# Altium footprint library Connectors THD.PcbLib: 631 footprints (part 40 of 46)
Each footprint in its own frame and in the unit in brackets; x right, y up, seen from the top. Pads: shape width x height; smd on the part's side, far side on the other; paste and mask are expansions set on the pad; w line width, h text height; cw(c..) or ccw(c..) is an arc to the next point about the centre after c.
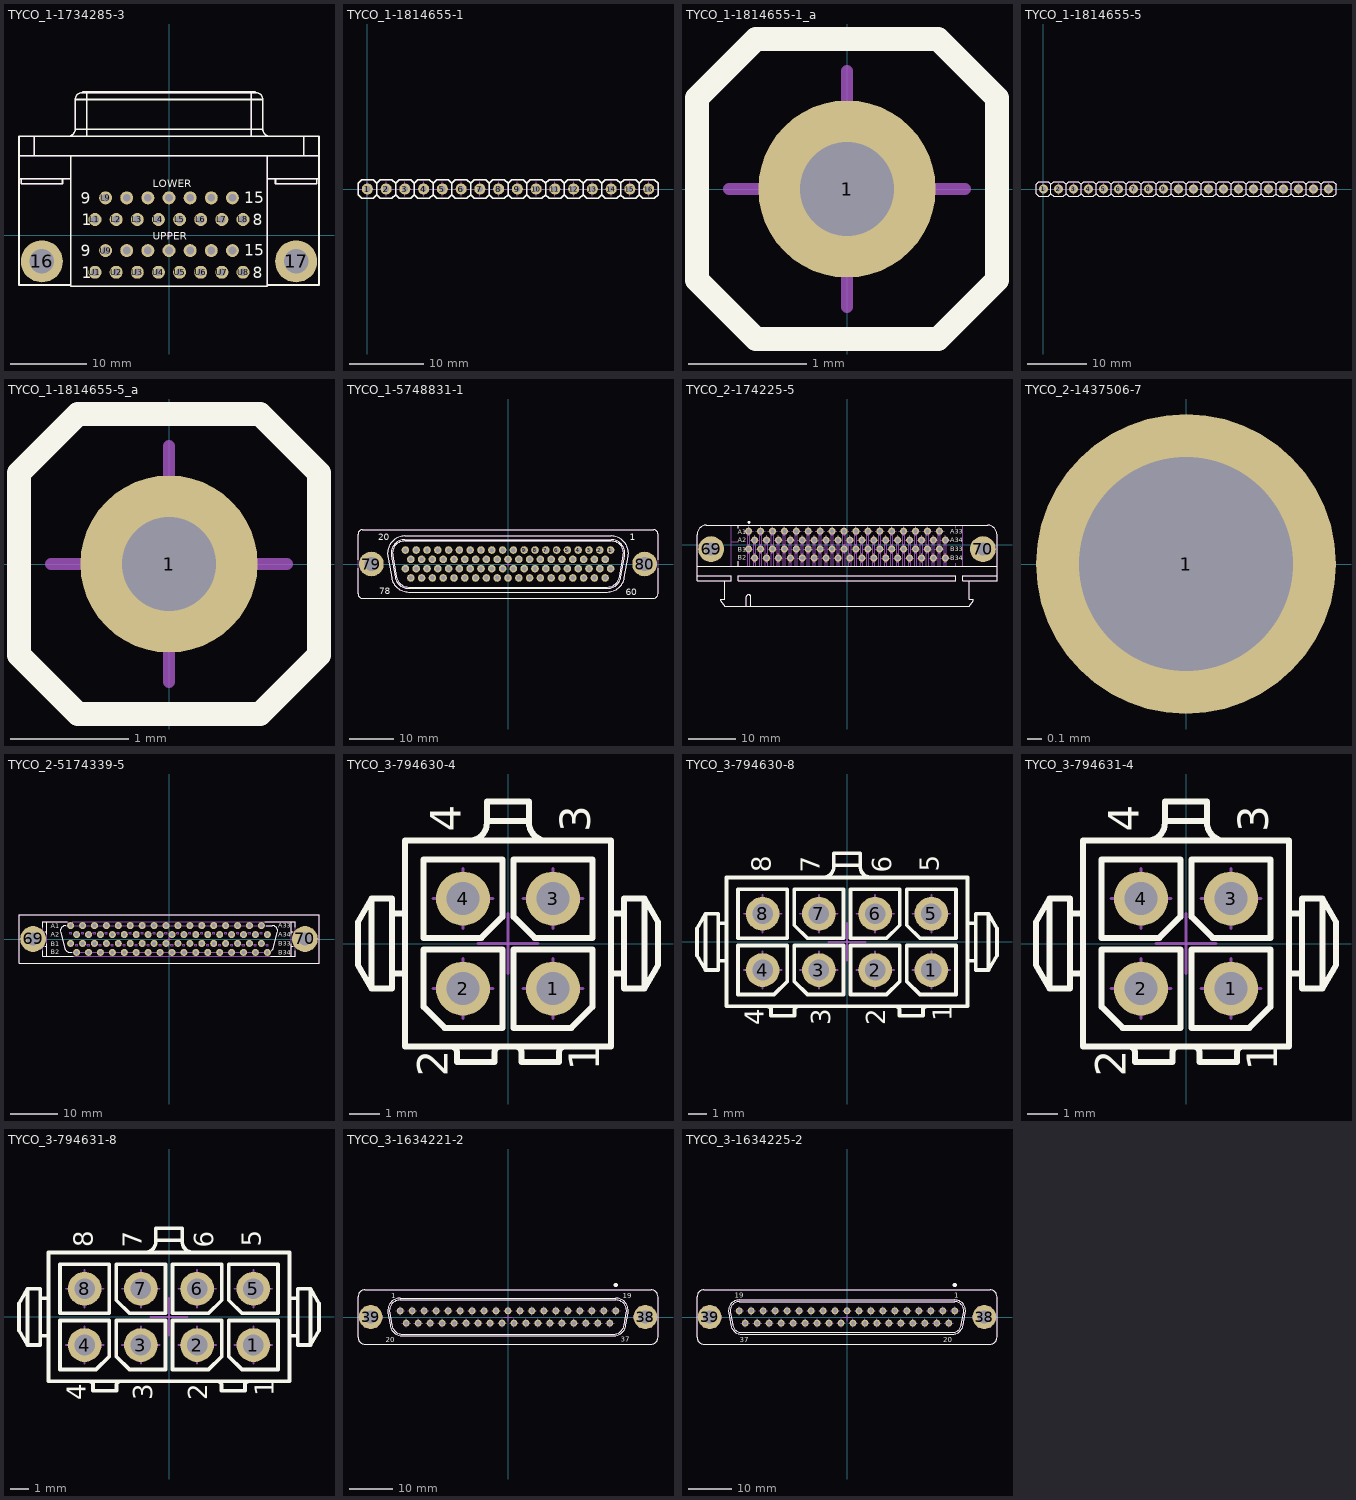
[diagram p39: the footprints below, top view; thin cyan lines are the x and y axes]

## TYCO_1-1734285-3 [mm] "Dual Stacked  Right Angled D-SUB 15 Pins Female Connector, With Threaded Insert UNC 4-40, And PCB Mount Retention"
height 31.9
pads (32):
  round 5.5 hole 3.2: 16(-16.65,-3.455) 17(16.65,-3.455)
  round 1.7 hole 1: L1(-9.695,2.035) L2(-6.925,2.035) L3(-4.155,2.035) L4(-1.385,2.035) L5(1.385,2.035) L6(4.155,2.035) L7(6.925,2.035) L8(9.695,2.035) L9(-8.31,4.875) L10(-5.54,4.875) L11(-2.77,4.875) L12(0,4.875) L13(2.77,4.875) L14(5.54,4.875) L15(8.31,4.875) U1(-9.695,-4.875) U2(-6.925,-4.875) U3(-4.155,-4.875) U4(-1.385,-4.875) U5(1.385,-4.875) U6(4.155,-4.875) U7(6.925,-4.875) U8(9.695,-4.875) U9(-8.31,-2.035) U10(-5.54,-2.035) U11(-2.77,-2.035) U12(0,-2.035) U13(2.77,-2.035) U14(5.54,-2.035) U15(8.31,-2.035)
Top Overlay:
  lines w0.2: -19.65,7.355 -12.9,7.355 ; -19.65,10.355 19.65,10.355 ; -19.35,7.355 -19.35,6.691 -13.95,6.691 -13.95,7.355 ; -17.65,10.355 -17.65,12.955 ; -13.2,12.955 ccw(c-13.2,13.855) -12.3,13.855 ; -12.9,-6.545 -19.65,-6.545 -19.65,12.955 19.65,12.955 19.65,-6.545 12.9,-6.545 ; -12.9,10.355 -12.9,-6.695 12.9,-6.695 12.9,10.355 ; -11.3,18.655 -11.3,18.755 11.3,18.755 11.3,18.655 ; -10.8,12.955 -10.8,18.755 ; 10.8,12.955 10.8,18.755 ; 12.9,7.355 19.65,7.355 ; 13.2,12.955 cw(c13.2,13.855) 12.3,13.855 ; 13.95,7.355 13.95,6.691 19.35,6.691 19.35,7.355 ; 17.65,10.355 17.65,12.955 ; -12.3,13.855 -12.3,17.755 ; -12.3,13.855 12.3,13.855 ; -12.3,17.755 cw(c-11.4,17.755) -11.4,18.655 11.399,18.655 cw(c11.4,17.755) 12.3,17.755 ; -12.3,17.755 12.3,17.755 ; 12.3,13.855 12.3,17.755
  text "15" at 9.881,-2.722 h1.5
  text "8" at 10.946,-5.637 h1.5
  text "1" at -11.454,-5.637 h1.5
  text "9" at -11.566,-2.797 h1.5
  text "9" at -11.566,4.113 h1.5
  text "1" at -11.454,1.273 h1.5
  text "8" at 10.946,1.273 h1.5
  text "15" at 9.881,4.188 h1.5
  text "UPPER" at -2.1,-0.65 h1
  text "LOWER" at -2.1,6.26 h1
Mechanical 8:
  lines w0.1: -10.195,-4.875 -9.695,-4.875 ; -10.195,2.035 -9.695,2.035 ; -9.695,-5.375 -9.695,-4.875 ; -9.695,-4.375 -9.695,-4.875 ; -9.695,1.535 -9.695,2.035 ; -9.695,2.535 -9.695,2.035 ; -9.195,-4.875 -9.695,-4.875 ; -9.195,2.035 -9.695,2.035 ; -8.81,-2.035 -8.31,-2.035 ; -8.81,4.875 -8.31,4.875 ; -8.31,-2.535 -8.31,-2.035 ; -8.31,-1.535 -8.31,-2.035 ; -8.31,4.375 -8.31,4.875 ; -8.31,5.375 -8.31,4.875 ; -7.81,-2.035 -8.31,-2.035 ; -7.81,4.875 -8.31,4.875 ; -7.425,-4.875 -6.925,-4.875 ; -7.425,2.035 -6.925,2.035 ; -6.925,-5.375 -6.925,-4.875 ; -6.925,-4.375 -6.925,-4.875 ; -6.925,1.535 -6.925,2.035 ; -6.925,2.535 -6.925,2.035 ; -6.425,-4.875 -6.925,-4.875 ; -6.425,2.035 -6.925,2.035 ; -6.04,-2.035 -5.54,-2.035 ; -6.04,4.875 -5.54,4.875 ; -5.54,-2.535 -5.54,-2.035 ; -5.54,-1.535 -5.54,-2.035 ; -5.54,4.375 -5.54,4.875 ; -5.54,5.375 -5.54,4.875 ; -5.04,-2.035 -5.54,-2.035 ; -5.04,4.875 -5.54,4.875 ; -4.66,-4.875 -4.16,-4.875 ; -4.66,2.035 -4.16,2.035 ; -4.16,-5.375 -4.16,-4.875 ; -4.16,-4.375 -4.16,-4.875 ; -4.16,1.535 -4.16,2.035 ; -4.16,2.535 -4.16,2.035 ; -3.66,-4.875 -4.16,-4.875 ; -3.66,2.035 -4.16,2.035 ; -3.27,-2.035 -2.77,-2.035 ; -3.27,4.875 -2.77,4.875 ; -2.77,-2.535 -2.77,-2.035 ; -2.77,-1.535 -2.77,-2.035 ; -2.77,4.375 -2.77,4.875 ; -2.77,5.375 -2.77,4.875 ; -2.27,-2.035 -2.77,-2.035 ; -2.27,4.875 -2.77,4.875 ; -1.885,-4.875 -1.385,-4.875 ; -1.885,2.035 -1.385,2.035 ; -1.385,-5.375 -1.385,-4.875 ; -1.385,-4.375 -1.385,-4.875 ; -1.385,1.535 -1.385,2.035 ; -1.385,2.535 -1.385,2.035 ; -0.885,-4.875 -1.385,-4.875 ; -0.885,2.035 -1.385,2.035 ; -0.5,-2.035 0,-2.035 ; -0.5,0 0,0 ; -0.5,4.875 0,4.875 ; 0,-2.535 0,-2.035 ; 0,-1.535 0,-2.035 ; 0,-0.5 0,0 ; 0,0.5 0,0 ; 0,4.375 0,4.875 ; 0,5.375 0,4.875 ; 0.5,-2.035 0,-2.035 ; 0.5,0 0,0 ; 0.5,4.875 0,4.875 ; 0.885,-4.875 1.385,-4.875 ; 0.885,2.035 1.385,2.035 ; 1.385,-5.375 1.385,-4.875 ; 1.385,-4.375 1.385,-4.875 ; 1.385,1.535 1.385,2.035 ; 1.385,2.535 1.385,2.035 ; 1.885,-4.875 1.385,-4.875 ; 1.885,2.035 1.385,2.035 ; 2.27,-2.035 2.77,-2.035 ; 2.27,4.875 2.77,4.875 ; 2.77,-2.535 2.77,-2.035 ; 2.77,-1.535 2.77,-2.035 ; 2.77,4.375 2.77,4.875 ; 2.77,5.375 2.77,4.875 ; 3.27,-2.035 2.77,-2.035 ; 3.27,4.875 2.77,4.875 ; 3.655,-4.875 4.155,-4.875 ; 3.655,2.035 4.155,2.035 ; 4.155,-5.375 4.155,-4.875 ; 4.155,-4.375 4.155,-4.875 ; 4.155,1.535 4.155,2.035 ; 4.155,2.535 4.155,2.035 ; 4.655,-4.875 4.155,-4.875 ; 4.655,2.035 4.155,2.035 ; 5.04,-2.035 5.54,-2.035 ; 5.04,4.875 5.54,4.875 ; 5.54,-2.535 5.54,-2.035 ; 5.54,-1.535 5.54,-2.035 ; 5.54,4.375 5.54,4.875 ; 5.54,5.375 5.54,4.875 ; 6.04,-2.035 5.54,-2.035 ; 6.04,4.875 5.54,4.875 ; 6.425,-4.875 6.925,-4.875 ; 6.425,2.035 6.925,2.035 ; 6.925,-5.375 6.925,-4.875 ; 6.925,-4.375 6.925,-4.875 ; 6.925,1.535 6.925,2.035 ; 6.925,2.535 6.925,2.035 ; 7.425,-4.875 6.925,-4.875 ; 7.425,2.035 6.925,2.035 ; 7.81,-2.035 8.31,-2.035 ; 7.81,4.875 8.31,4.875 ; 8.31,-2.535 8.31,-2.035 ; 8.31,-1.535 8.31,-2.035 ; 8.31,4.375 8.31,4.875 ; 8.31,5.375 8.31,4.875 ; 8.81,-2.035 8.31,-2.035 ; 8.81,4.875 8.31,4.875 ; 9.195,-4.875 9.695,-4.875 ; 9.195,2.035 9.695,2.035 ; 9.695,-5.375 9.695,-4.875 ; 9.695,-4.375 9.695,-4.875 ; 9.695,1.535 9.695,2.035 ; 9.695,2.535 9.695,2.035 ; 10.195,-4.875 9.695,-4.875 ; 10.195,2.035 9.695,2.035
Mechanical 14:
  drawing of 6656 lines, arcs and shapes, not listed
  text "UPPER" at -2.1,-0.65 h1
  text "LOWER" at -2.1,6.26 h1
  text "15" at 9.881,4.188 h1.5
  text "8" at 10.946,1.273 h1.5
  text "1" at -11.454,1.273 h1.5
  text "9" at -11.566,4.113 h1.5
  text "9" at -11.566,-2.797 h1.5
  text "1" at -11.454,-5.637 h1.5
  text "8" at 10.946,-5.637 h1.5
  text "15" at 9.881,-2.722 h1.5
3D body: height 31.6, standoff -3.55, extent -19.3,-7.675 20,17.825

## TYCO_1-1814655-1 [mm] "16 Positions, Pitch 2.54mm, Width 2.54mm, Heigh 4.4mm, SIP Straight Socket"
height 4.4
pads (16):
  round 1.5 hole 0.8: 1(0,0) 2(2.54,0) 3(5.08,0) 4(7.62,0) 5(10.16,0) 6(12.7,0) 7(15.24,0) 8(17.78,0) 9(20.32,0) 10(22.86,0) 11(25.4,0) 12(27.94,0) 13(30.48,0) 14(33.02,0) 15(35.56,0) 16(38.1,0)
Top Overlay:
  lines w0.2: 1.27,-0.77 0.77,-1.27 -0.77,-1.27 -1.27,-0.77 -1.27,0.77 -0.77,1.27 0.77,1.27 1.27,0.77 ; 1.27,-0.77 1.77,-1.27 3.31,-1.27 3.81,-0.77 ; 1.27,-0.77 1.27,0.77 ; 1.27,0.77 1.77,1.27 3.31,1.27 3.81,0.77 ; 3.81,-0.77 4.31,-1.27 5.85,-1.27 6.35,-0.77 ; 3.81,-0.77 3.81,0.77 ; 3.81,0.77 4.31,1.27 5.85,1.27 6.35,0.77 ; 6.35,-0.77 6.85,-1.27 8.39,-1.27 8.89,-0.77 ; 6.35,-0.77 6.35,0.77 ; 6.35,0.77 6.85,1.27 8.39,1.27 8.89,0.77 ; 8.89,-0.77 9.39,-1.27 10.93,-1.27 11.43,-0.77 ; 8.89,-0.77 8.89,0.77 ; 8.89,0.77 9.39,1.27 10.93,1.27 11.43,0.77 ; 11.43,-0.77 11.93,-1.27 13.47,-1.27 13.97,-0.77 ; 11.43,-0.77 11.43,0.77 ; 11.43,0.77 11.93,1.27 13.47,1.27 13.97,0.77 ; 13.97,-0.77 14.47,-1.27 16.01,-1.27 16.51,-0.77 ; 13.97,-0.77 13.97,0.77 ; 13.97,0.77 14.47,1.27 16.01,1.27 16.51,0.77 ; 16.51,-0.77 17.01,-1.27 18.55,-1.27 19.05,-0.77 ; 16.51,-0.77 16.51,0.77 ; 16.51,0.77 17.01,1.27 18.55,1.27 19.05,0.77 ; 19.05,-0.77 19.55,-1.27 21.09,-1.27 21.59,-0.77 ; 19.05,-0.77 19.05,0.77 ; 19.05,0.77 19.55,1.27 21.09,1.27 21.59,0.77 ; 21.59,-0.77 22.09,-1.27 23.63,-1.27 24.13,-0.77 ; 21.59,-0.77 21.59,0.77 ; 21.59,0.77 22.09,1.27 23.63,1.27 24.13,0.77 ; 24.13,-0.77 24.63,-1.27 26.17,-1.27 26.67,-0.77 ; 24.13,-0.77 24.13,0.77 ; 24.13,0.77 24.63,1.27 26.17,1.27 26.67,0.77 ; 26.67,-0.77 26.67,0.77 ; 26.67,-0.77 27.17,-1.27 28.71,-1.27 29.21,-0.77 ; 26.67,0.77 27.17,1.27 28.71,1.27 29.21,0.77 ; 29.21,-0.77 29.21,0.77 ; 29.21,-0.77 29.71,-1.27 31.25,-1.27 31.75,-0.77 ; 29.21,0.77 29.71,1.27 31.25,1.27 31.75,0.77 ; 31.75,-0.77 31.75,0.77 ; 31.75,-0.77 32.25,-1.27 33.79,-1.27 34.29,-0.77 ; 31.75,0.77 32.25,1.27 33.79,1.27 34.29,0.77 ; 34.29,-0.77 34.79,-1.27 36.33,-1.27 36.83,-0.77 ; 34.29,-0.77 34.29,0.77 ; 34.29,0.77 34.79,1.27 36.33,1.27 36.83,0.77 ; 36.83,-0.77 37.33,-1.27 38.87,-1.27 39.37,-0.77 39.37,0.77 38.87,1.27 37.33,1.27 36.83,0.77 ; 36.83,-0.77 36.83,0.77
Mechanical 8:
  lines w0.1: -1,0 0,0 ; 0,-1 0,0 ; 0,1 0,0 ; 1,0 0,0 ; 1.54,0 2.54,0 ; 2.54,-1 2.54,0 ; 2.54,1 2.54,0 ; 3.54,0 2.54,0 ; 4.08,0 5.08,0 ; 5.08,-1 5.08,0 ; 5.08,1 5.08,0 ; 6.08,0 5.08,0 ; 6.62,0 7.62,0 ; 7.62,-1 7.62,0 ; 7.62,1 7.62,0 ; 8.62,0 7.62,0 ; 9.16,0 10.16,0 ; 10.16,-1 10.16,0 ; 10.16,1 10.16,0 ; 11.16,0 10.16,0 ; 11.7,0 12.7,0 ; 12.7,-1 12.7,0 ; 12.7,1 12.7,0 ; 13.7,0 12.7,0 ; 14.24,0 15.24,0 ; 15.24,-1 15.24,0 ; 15.24,1 15.24,0 ; 16.24,0 15.24,0 ; 16.78,0 17.78,0 ; 17.78,-1 17.78,0 ; 17.78,1 17.78,0 ; 18.78,0 17.78,0 ; 19.32,0 20.32,0 ; 20.32,-1 20.32,0 ; 20.32,1 20.32,0 ; 21.32,0 20.32,0 ; 21.86,0 22.86,0 ; 22.86,-1 22.86,0 ; 22.86,1 22.86,0 ; 23.86,0 22.86,0 ; 24.4,0 25.4,0 ; 25.4,-1 25.4,0 ; 25.4,1 25.4,0 ; 26.4,0 25.4,0 ; 26.94,0 27.94,0 ; 27.94,-1 27.94,0 ; 27.94,1 27.94,0 ; 28.94,0 27.94,0 ; 29.48,0 30.48,0 ; 30.48,-1 30.48,0 ; 30.48,1 30.48,0 ; 31.48,0 30.48,0 ; 32.02,0 33.02,0 ; 33.02,-1 33.02,0 ; 33.02,1 33.02,0 ; 34.02,0 33.02,0 ; 34.56,0 35.56,0 ; 35.56,-1 35.56,0 ; 35.56,1 35.56,0 ; 36.56,0 35.56,0 ; 37.1,0 38.1,0 ; 38.1,-1 38.1,0 ; 38.1,1 38.1,0 ; 39.1,0 38.1,0
Mechanical 14:
  lines w0.1: 1.27,-0.77 0.77,-1.27 -0.77,-1.27 -1.27,-0.77 -1.27,0.77 -0.77,1.27 0.77,1.27 1.27,0.77 ; 1.27,-0.77 1.77,-1.27 3.31,-1.27 3.81,-0.77 ; 1.27,-0.77 1.27,0.77 ; 1.27,0.77 1.77,1.27 3.31,1.27 3.81,0.77 ; 3.81,-0.77 4.31,-1.27 5.85,-1.27 6.35,-0.77 ; 3.81,-0.77 3.81,0.77 ; 3.81,0.77 4.31,1.27 5.85,1.27 6.35,0.77 ; 6.35,-0.77 6.85,-1.27 8.39,-1.27 8.89,-0.77 ; 6.35,-0.77 6.35,0.77 ; 6.35,0.77 6.85,1.27 8.39,1.27 8.89,0.77 ; 8.89,-0.77 9.39,-1.27 10.93,-1.27 11.43,-0.77 ; 8.89,-0.77 8.89,0.77 ; 8.89,0.77 9.39,1.27 10.93,1.27 11.43,0.77 ; 11.43,-0.77 11.93,-1.27 13.47,-1.27 13.97,-0.77 ; 11.43,-0.77 11.43,0.77 ; 11.43,0.77 11.93,1.27 13.47,1.27 13.97,0.77 ; 13.97,-0.77 14.47,-1.27 16.01,-1.27 16.51,-0.77 ; 13.97,-0.77 13.97,0.77 ; 13.97,0.77 14.47,1.27 16.01,1.27 16.51,0.77 ; 16.51,-0.77 17.01,-1.27 18.55,-1.27 19.05,-0.77 ; 16.51,-0.77 16.51,0.77 ; 16.51,0.77 17.01,1.27 18.55,1.27 19.05,0.77 ; 19.05,-0.77 19.55,-1.27 21.09,-1.27 21.59,-0.77 ; 19.05,-0.77 19.05,0.77 ; 19.05,0.77 19.55,1.27 21.09,1.27 21.59,0.77 ; 21.59,-0.77 22.09,-1.27 23.63,-1.27 24.13,-0.77 ; 21.59,-0.77 21.59,0.77 ; 21.59,0.77 22.09,1.27 23.63,1.27 24.13,0.77 ; 24.13,-0.77 24.63,-1.27 26.17,-1.27 26.67,-0.77 ; 24.13,-0.77 24.13,0.77 ; 24.13,0.77 24.63,1.27 26.17,1.27 26.67,0.77 ; 26.67,-0.77 26.67,0.77 ; 26.67,-0.77 27.17,-1.27 28.71,-1.27 29.21,-0.77 ; 26.67,0.77 27.17,1.27 28.71,1.27 29.21,0.77 ; 29.21,-0.77 29.21,0.77 ; 29.21,-0.77 29.71,-1.27 31.25,-1.27 31.75,-0.77 ; 29.21,0.77 29.71,1.27 31.25,1.27 31.75,0.77 ; 31.75,-0.77 31.75,0.77 ; 31.75,-0.77 32.25,-1.27 33.79,-1.27 34.29,-0.77 ; 31.75,0.77 32.25,1.27 33.79,1.27 34.29,0.77 ; 34.29,-0.77 34.79,-1.27 36.33,-1.27 36.83,-0.77 ; 34.29,-0.77 34.29,0.77 ; 34.29,0.77 34.79,1.27 36.33,1.27 36.83,0.77 ; 36.83,-0.77 37.33,-1.27 38.87,-1.27 39.37,-0.77 39.37,0.77 38.87,1.27 37.33,1.27 36.83,0.77 ; 36.83,-0.77 36.83,0.77
3D body: height 4.4, standoff -2.9, extent -1.27,-1.27 39.37,1.27

## TYCO_1-1814655-1_a [mm] "1 of 16 Positions, Pitch 2.54mm, Width 2.54mm, Heigh 4.4mm, SIP Straight Socket"
height 4.4
pads (1):
  round 1.5 hole 0.8: 1(0,0)
Top Overlay:
  lines w0.2: -1.27,-0.77 -0.77,-1.27 0.77,-1.27 1.27,-0.77 1.27,0.77 0.77,1.27 -0.77,1.27 -1.27,0.77 -1.27,-0.77
Mechanical 8:
  lines w0.1: -1,0 0,0 ; 0,-1 0,0 ; 0,1 0,0 ; 1,0 0,0
Mechanical 14:
  lines w0.1: -1.27,-0.77 -0.77,-1.27 0.77,-1.27 1.27,-0.77 1.27,0.77 0.77,1.27 -0.77,1.27 -1.27,0.77 -1.27,-0.77
3D body: height 4.4, standoff -2.9, extent -1.27,-1.27 1.27,1.27

## TYCO_1-1814655-5 [mm] "20 Positions, Pitch 2.54mm, Width 2.54mm, Heigh 4.4mm, SIP Straight Socket"
height 4.4
pads (20):
  round 1.5 hole 0.8: 1(0,0) 2(2.54,0) 3(5.08,0) 4(7.62,0) 5(10.16,0) 6(12.7,0) 7(15.24,0) 8(17.78,0) 9(20.32,0) 10(22.86,0) 11(25.4,0) 12(27.94,0) 13(30.48,0) 14(33.02,0) 15(35.56,0) 16(38.1,0) 17(40.64,0) 18(43.18,0) 19(45.72,0) 20(48.26,0)
Top Overlay:
  lines w0.2: 1.27,-0.77 1.27,0.77 ; 1.27,-0.77 1.77,-1.27 3.31,-1.27 3.81,-0.77 ; 1.27,-0.77 0.77,-1.27 -0.77,-1.27 -1.27,-0.77 -1.27,0.77 -0.77,1.27 0.77,1.27 1.27,0.77 ; 1.27,0.77 1.77,1.27 3.31,1.27 3.81,0.77 ; 3.81,-0.77 3.81,0.77 ; 3.81,-0.77 4.31,-1.27 5.85,-1.27 6.35,-0.77 ; 3.81,0.77 4.31,1.27 5.85,1.27 6.35,0.77 ; 6.35,-0.77 6.35,0.77 ; 6.35,-0.77 6.85,-1.27 8.39,-1.27 8.89,-0.77 ; 6.35,0.77 6.85,1.27 8.39,1.27 8.89,0.77 ; 8.89,-0.77 8.89,0.77 ; 8.89,-0.77 9.39,-1.27 10.93,-1.27 11.43,-0.77 ; 8.89,0.77 9.39,1.27 10.93,1.27 11.43,0.77 ; 11.43,-0.77 11.43,0.77 ; 11.43,-0.77 11.93,-1.27 13.47,-1.27 13.97,-0.77 ; 11.43,0.77 11.93,1.27 13.47,1.27 13.97,0.77 ; 13.97,-0.77 13.97,0.77 ; 13.97,-0.77 14.47,-1.27 16.01,-1.27 16.51,-0.77 ; 13.97,0.77 14.47,1.27 16.01,1.27 16.51,0.77 ; 16.51,-0.77 16.51,0.77 ; 16.51,-0.77 17.01,-1.27 18.55,-1.27 19.05,-0.77 ; 16.51,0.77 17.01,1.27 18.55,1.27 19.05,0.77 ; 19.05,-0.77 19.05,0.77 ; 19.05,-0.77 19.55,-1.27 21.09,-1.27 21.59,-0.77 ; 19.05,0.77 19.55,1.27 21.09,1.27 21.59,0.77 ; 21.59,-0.77 21.59,0.77 ; 21.59,-0.77 22.09,-1.27 23.63,-1.27 24.13,-0.77 ; 21.59,0.77 22.09,1.27 23.63,1.27 24.13,0.77 ; 24.13,-0.77 24.13,0.77 ; 24.13,-0.77 24.63,-1.27 26.17,-1.27 26.67,-0.77 ; 24.13,0.77 24.63,1.27 26.17,1.27 26.67,0.77 ; 26.67,-0.77 27.17,-1.27 28.71,-1.27 29.21,-0.77 ; 26.67,-0.77 26.67,0.77 ; 26.67,0.77 27.17,1.27 28.71,1.27 29.21,0.77 ; 29.21,-0.77 29.71,-1.27 31.25,-1.27 31.75,-0.77 ; 29.21,-0.77 29.21,0.77 ; 29.21,0.77 29.71,1.27 31.25,1.27 31.75,0.77 ; 31.75,-0.77 32.25,-1.27 33.79,-1.27 34.29,-0.77 ; 31.75,-0.77 31.75,0.77 ; 31.75,0.77 32.25,1.27 33.79,1.27 34.29,0.77 ; 34.29,-0.77 34.29,0.77 ; 34.29,-0.77 34.79,-1.27 36.33,-1.27 36.83,-0.77 ; 34.29,0.77 34.79,1.27 36.33,1.27 36.83,0.77 ; 36.83,-0.77 36.83,0.77 ; 36.83,-0.77 37.33,-1.27 38.87,-1.27 39.37,-0.77 ; 36.83,0.77 37.33,1.27 38.87,1.27 39.37,0.77 ; 39.37,-0.77 39.87,-1.27 41.41,-1.27 41.91,-0.77 ; 39.37,-0.77 39.37,0.77 ; 39.37,0.77 39.87,1.27 41.41,1.27 41.91,0.77 ; 41.91,-0.77 41.91,0.77 ; 41.91,-0.77 42.41,-1.27 43.95,-1.27 44.45,-0.77 ; 41.91,0.77 42.41,1.27 43.95,1.27 44.45,0.77 ; 44.45,-0.77 44.95,-1.27 46.49,-1.27 46.99,-0.77 ; 44.45,-0.77 44.45,0.77 ; 44.45,0.77 44.95,1.27 46.49,1.27 46.99,0.77 ; 46.99,-0.77 47.49,-1.27 49.03,-1.27 49.53,-0.77 49.53,0.77 49.03,1.27 47.49,1.27 46.99,0.77 ; 46.99,-0.77 46.99,0.77
Mechanical 8:
  lines w0.1: -1,0 0,0 ; 0,-1 0,0 ; 0,1 0,0 ; 1,0 0,0 ; 1.54,0 2.54,0 ; 2.54,-1 2.54,0 ; 2.54,1 2.54,0 ; 3.54,0 2.54,0 ; 4.08,0 5.08,0 ; 5.08,-1 5.08,0 ; 5.08,1 5.08,0 ; 6.08,0 5.08,0 ; 6.62,0 7.62,0 ; 7.62,-1 7.62,0 ; 7.62,1 7.62,0 ; 8.62,0 7.62,0 ; 9.16,0 10.16,0 ; 10.16,-1 10.16,0 ; 10.16,1 10.16,0 ; 11.16,0 10.16,0 ; 11.7,0 12.7,0 ; 12.7,-1 12.7,0 ; 12.7,1 12.7,0 ; 13.7,0 12.7,0 ; 14.24,0 15.24,0 ; 15.24,-1 15.24,0 ; 15.24,1 15.24,0 ; 16.24,0 15.24,0 ; 16.78,0 17.78,0 ; 17.78,-1 17.78,0 ; 17.78,1 17.78,0 ; 18.78,0 17.78,0 ; 19.32,0 20.32,0 ; 20.32,-1 20.32,0 ; 20.32,1 20.32,0 ; 21.32,0 20.32,0 ; 21.86,0 22.86,0 ; 22.86,-1 22.86,0 ; 22.86,1 22.86,0 ; 23.86,0 22.86,0 ; 24.4,0 25.4,0 ; 25.4,-1 25.4,0 ; 25.4,1 25.4,0 ; 26.4,0 25.4,0 ; 26.94,0 27.94,0 ; 27.94,-1 27.94,0 ; 27.94,1 27.94,0 ; 28.94,0 27.94,0 ; 29.48,0 30.48,0 ; 30.48,-1 30.48,0 ; 30.48,1 30.48,0 ; 31.48,0 30.48,0 ; 32.02,0 33.02,0 ; 33.02,-1 33.02,0 ; 33.02,1 33.02,0 ; 34.02,0 33.02,0 ; 34.56,0 35.56,0 ; 35.56,-1 35.56,0 ; 35.56,1 35.56,0 ; 36.56,0 35.56,0 ; 37.1,0 38.1,0 ; 38.1,-1 38.1,0 ; 38.1,1 38.1,0 ; 39.1,0 38.1,0 ; 39.64,0 40.64,0 ; 40.64,-1 40.64,0 ; 40.64,1 40.64,0 ; 41.64,0 40.64,0 ; 42.18,0 43.18,0 ; 43.18,-1 43.18,0 ; 43.18,1 43.18,0 ; 44.18,0 43.18,0 ; 44.72,0 45.72,0 ; 45.72,-1 45.72,0 ; 45.72,1 45.72,0 ; 46.72,0 45.72,0 ; 47.26,0 48.26,0 ; 48.26,-1 48.26,0 ; 48.26,1 48.26,0 ; 49.26,0 48.26,0
Mechanical 14:
  lines w0.1: 1.27,-0.77 1.27,0.77 ; 1.27,-0.77 1.77,-1.27 3.31,-1.27 3.81,-0.77 ; 1.27,-0.77 0.77,-1.27 -0.77,-1.27 -1.27,-0.77 -1.27,0.77 -0.77,1.27 0.77,1.27 1.27,0.77 ; 1.27,0.77 1.77,1.27 3.31,1.27 3.81,0.77 ; 3.81,-0.77 3.81,0.77 ; 3.81,-0.77 4.31,-1.27 5.85,-1.27 6.35,-0.77 ; 3.81,0.77 4.31,1.27 5.85,1.27 6.35,0.77 ; 6.35,-0.77 6.35,0.77 ; 6.35,-0.77 6.85,-1.27 8.39,-1.27 8.89,-0.77 ; 6.35,0.77 6.85,1.27 8.39,1.27 8.89,0.77 ; 8.89,-0.77 8.89,0.77 ; 8.89,-0.77 9.39,-1.27 10.93,-1.27 11.43,-0.77 ; 8.89,0.77 9.39,1.27 10.93,1.27 11.43,0.77 ; 11.43,-0.77 11.43,0.77 ; 11.43,-0.77 11.93,-1.27 13.47,-1.27 13.97,-0.77 ; 11.43,0.77 11.93,1.27 13.47,1.27 13.97,0.77 ; 13.97,-0.77 13.97,0.77 ; 13.97,-0.77 14.47,-1.27 16.01,-1.27 16.51,-0.77 ; 13.97,0.77 14.47,1.27 16.01,1.27 16.51,0.77 ; 16.51,-0.77 16.51,0.77 ; 16.51,-0.77 17.01,-1.27 18.55,-1.27 19.05,-0.77 ; 16.51,0.77 17.01,1.27 18.55,1.27 19.05,0.77 ; 19.05,-0.77 19.05,0.77 ; 19.05,-0.77 19.55,-1.27 21.09,-1.27 21.59,-0.77 ; 19.05,0.77 19.55,1.27 21.09,1.27 21.59,0.77 ; 21.59,-0.77 21.59,0.77 ; 21.59,-0.77 22.09,-1.27 23.63,-1.27 24.13,-0.77 ; 21.59,0.77 22.09,1.27 23.63,1.27 24.13,0.77 ; 24.13,-0.77 24.13,0.77 ; 24.13,-0.77 24.63,-1.27 26.17,-1.27 26.67,-0.77 ; 24.13,0.77 24.63,1.27 26.17,1.27 26.67,0.77 ; 26.67,-0.77 27.17,-1.27 28.71,-1.27 29.21,-0.77 ; 26.67,-0.77 26.67,0.77 ; 26.67,0.77 27.17,1.27 28.71,1.27 29.21,0.77 ; 29.21,-0.77 29.71,-1.27 31.25,-1.27 31.75,-0.77 ; 29.21,-0.77 29.21,0.77 ; 29.21,0.77 29.71,1.27 31.25,1.27 31.75,0.77 ; 31.75,-0.77 32.25,-1.27 33.79,-1.27 34.29,-0.77 ; 31.75,-0.77 31.75,0.77 ; 31.75,0.77 32.25,1.27 33.79,1.27 34.29,0.77 ; 34.29,-0.77 34.29,0.77 ; 34.29,-0.77 34.79,-1.27 36.33,-1.27 36.83,-0.77 ; 34.29,0.77 34.79,1.27 36.33,1.27 36.83,0.77 ; 36.83,-0.77 36.83,0.77 ; 36.83,-0.77 37.33,-1.27 38.87,-1.27 39.37,-0.77 ; 36.83,0.77 37.33,1.27 38.87,1.27 39.37,0.77 ; 39.37,-0.77 39.87,-1.27 41.41,-1.27 41.91,-0.77 ; 39.37,-0.77 39.37,0.77 ; 39.37,0.77 39.87,1.27 41.41,1.27 41.91,0.77 ; 41.91,-0.77 41.91,0.77 ; 41.91,-0.77 42.41,-1.27 43.95,-1.27 44.45,-0.77 ; 41.91,0.77 42.41,1.27 43.95,1.27 44.45,0.77 ; 44.45,-0.77 44.95,-1.27 46.49,-1.27 46.99,-0.77 ; 44.45,-0.77 44.45,0.77 ; 44.45,0.77 44.95,1.27 46.49,1.27 46.99,0.77 ; 46.99,-0.77 47.49,-1.27 49.03,-1.27 49.53,-0.77 49.53,0.77 49.03,1.27 47.49,1.27 46.99,0.77 ; 46.99,-0.77 46.99,0.77
3D body: height 4.4, standoff -2.9, extent -1.27,-1.27 49.53,1.27

## TYCO_1-1814655-5_a [mm] "1 of 20 Positions, Pitch 2.54mm, Width 2.54mm, Heigh 4.4mm, SIP Straight Socket"
height 4.4
pads (1):
  round 1.5 hole 0.8: 1(0,0)
Top Overlay:
  lines w0.2: -1.27,-0.77 -0.77,-1.27 0.77,-1.27 1.27,-0.77 1.27,0.77 0.77,1.27 -0.77,1.27 -1.27,0.77 -1.27,-0.77
Mechanical 8:
  lines w0.1: -1,0 0,0 ; 0,-1 0,0 ; 0,1 0,0 ; 1,0 0,0
Mechanical 14:
  lines w0.1: -1.27,-0.77 -0.77,-1.27 0.77,-1.27 1.27,-0.77 1.27,0.77 0.77,1.27 -0.77,1.27 -1.27,0.77 -1.27,-0.77
3D body: height 4.4, standoff -2.9, extent -1.27,-1.27 1.27,1.27

## TYCO_1-5748831-1 [mm] "Straight D-SUB 78 Female Contacts, Shell Size 5, With Boardlock and Threaded Insert,(4-40 UNC), HD-22 Serie"
height 12.48
pads (80):
  round 1.7 hole 1: 1(22.914,3.12) 2(20.502,3.12) 3(18.09,3.12) 4(15.678,3.12) 5(13.266,3.12) 6(10.854,3.12) 7(8.442,3.12) 8(6.03,3.12) 9(3.618,3.12) 10(1.206,3.12) 11(-1.206,3.12) 12(-3.618,3.12) 13(-6.03,3.12) 14(-8.442,3.12) 15(-10.854,3.12) 16(-13.266,3.12) 17(-15.678,3.12) 18(-18.09,3.12) 19(-20.502,3.12) 20(-22.914,3.12) 21(21.708,1.04) 22(19.296,1.04) 23(16.884,1.04) 24(14.472,1.04) 25(12.06,1.04) 26(9.648,1.04) 27(7.236,1.04) 28(4.824,1.04) 29(2.412,1.04) 30(0,1.04) 31(-2.412,1.04) 32(-4.824,1.04) 33(-7.236,1.04) 34(-9.648,1.04) 35(-12.06,1.04) 36(-14.472,1.04) 37(-16.884,1.04) 38(-19.296,1.04) 39(-21.708,1.04) 40(22.914,-1.04) 41(20.502,-1.04) 42(18.09,-1.04) 43(15.678,-1.04) 44(13.266,-1.04) 45(10.854,-1.04) 46(8.442,-1.04) 47(6.03,-1.04) 48(3.618,-1.04) 49(1.206,-1.04) 50(-1.206,-1.04) 51(-3.618,-1.04) 52(-6.03,-1.04) 53(-8.442,-1.04) 54(-10.854,-1.04) 55(-13.266,-1.04) 56(-15.678,-1.04) 57(-18.09,-1.04) 58(-20.502,-1.04) 59(-22.914,-1.04) 60(21.708,-3.12) 61(19.296,-3.12) 62(16.884,-3.12) 63(14.472,-3.12) 64(12.06,-3.12) 65(9.648,-3.12) 66(7.236,-3.12) 67(4.824,-3.12) 68(2.412,-3.12) 69(0,-3.12) 70(-2.412,-3.12) 71(-4.824,-3.12) 72(-7.236,-3.12) 73(-9.648,-3.12) 74(-12.06,-3.12) 75(-14.472,-3.12) 76(-16.884,-3.12) 77(-19.296,-3.12) 78(-21.708,-3.12)
  round 5.5 hole 3.1: 79(-30.5,0) 80(30.5,0)
Top Overlay:
  lines w0.2: -33.5,-0.96 -33.5,-6.65 ccw(c-32.5,-6.65) -32.5,-7.65 32.5,-7.65 ccw(c32.5,-6.65) 33.5,-6.65 33.5,-0.96 ; -33.5,0.96 -33.5,6.65 cw(c-32.5,6.65) -32.5,7.65 32.5,7.65 cw(c32.5,6.65) 33.5,6.65 33.5,0.96 ; -26.913,2.402 cw(c-23.052,2.402) -23.052,6.263 23.052,6.263 cw(c23.052,2.402) 26.854,1.732 26.007,-3.072 cw(c22.205,-2.402) 22.205,-6.263 -22.205,-6.263 cw(c-22.205,-2.402) -26.007,-3.072 -26.913,2.402 ; -26.054,1.873 cw(c-23.052,2.402) -23.052,5.45 23.052,5.45 cw(c23.052,2.402) 26.054,1.873 25.219,-2.933 cw(c22.195,-2.376) 22.205,-5.45 -22.205,-5.45 cw(c-22.205,-2.402) -25.207,-2.931 -26.054,1.873 ; -25.758,1.925 cw(c-23.052,2.402) -23.052,5.15 23.052,5.15 cw(c23.052,2.402) 25.758,1.925 24.911,-2.879 cw(c22.205,-2.402) 22.205,-5.15 -22.205,-5.15 cw(c-22.205,-2.402) -24.911,-2.879 -25.758,1.925
  text "60" at 26.271,-6.927 h1.5
  text "1" at 27.146,5.263 h1.5
  text "78" at -28.704,-6.715 h1.5
  text "20" at -28.929,5.348 h1.5
Mechanical 8:
  drawing of 168 lines, arcs and shapes, not listed
Mechanical 14:
  drawing of 196 lines, arcs and shapes, not listed
  text "1" at 27.146,5.263 h1.5
  text "60" at 26.271,-6.927 h1.5
  text "78" at -28.704,-6.715 h1.5
  text "20" at -28.929,5.348 h1.5
3D body: height 12.1, standoff -3.18, extent -33.5,-7.65 33.5,7.65
